# Altium footprint library NFC-Reader.PcbLib: 67 footprints (part 4 of 5)
Each footprint in its own frame and in the unit in brackets; x right, y up, seen from the top. Pads: shape width x height; smd on the part's side, far side on the other; paste and mask are expansions set on the pad; w line width, h text height; cw(c..) or ccw(c..) is an arc to the next point about the centre after c.
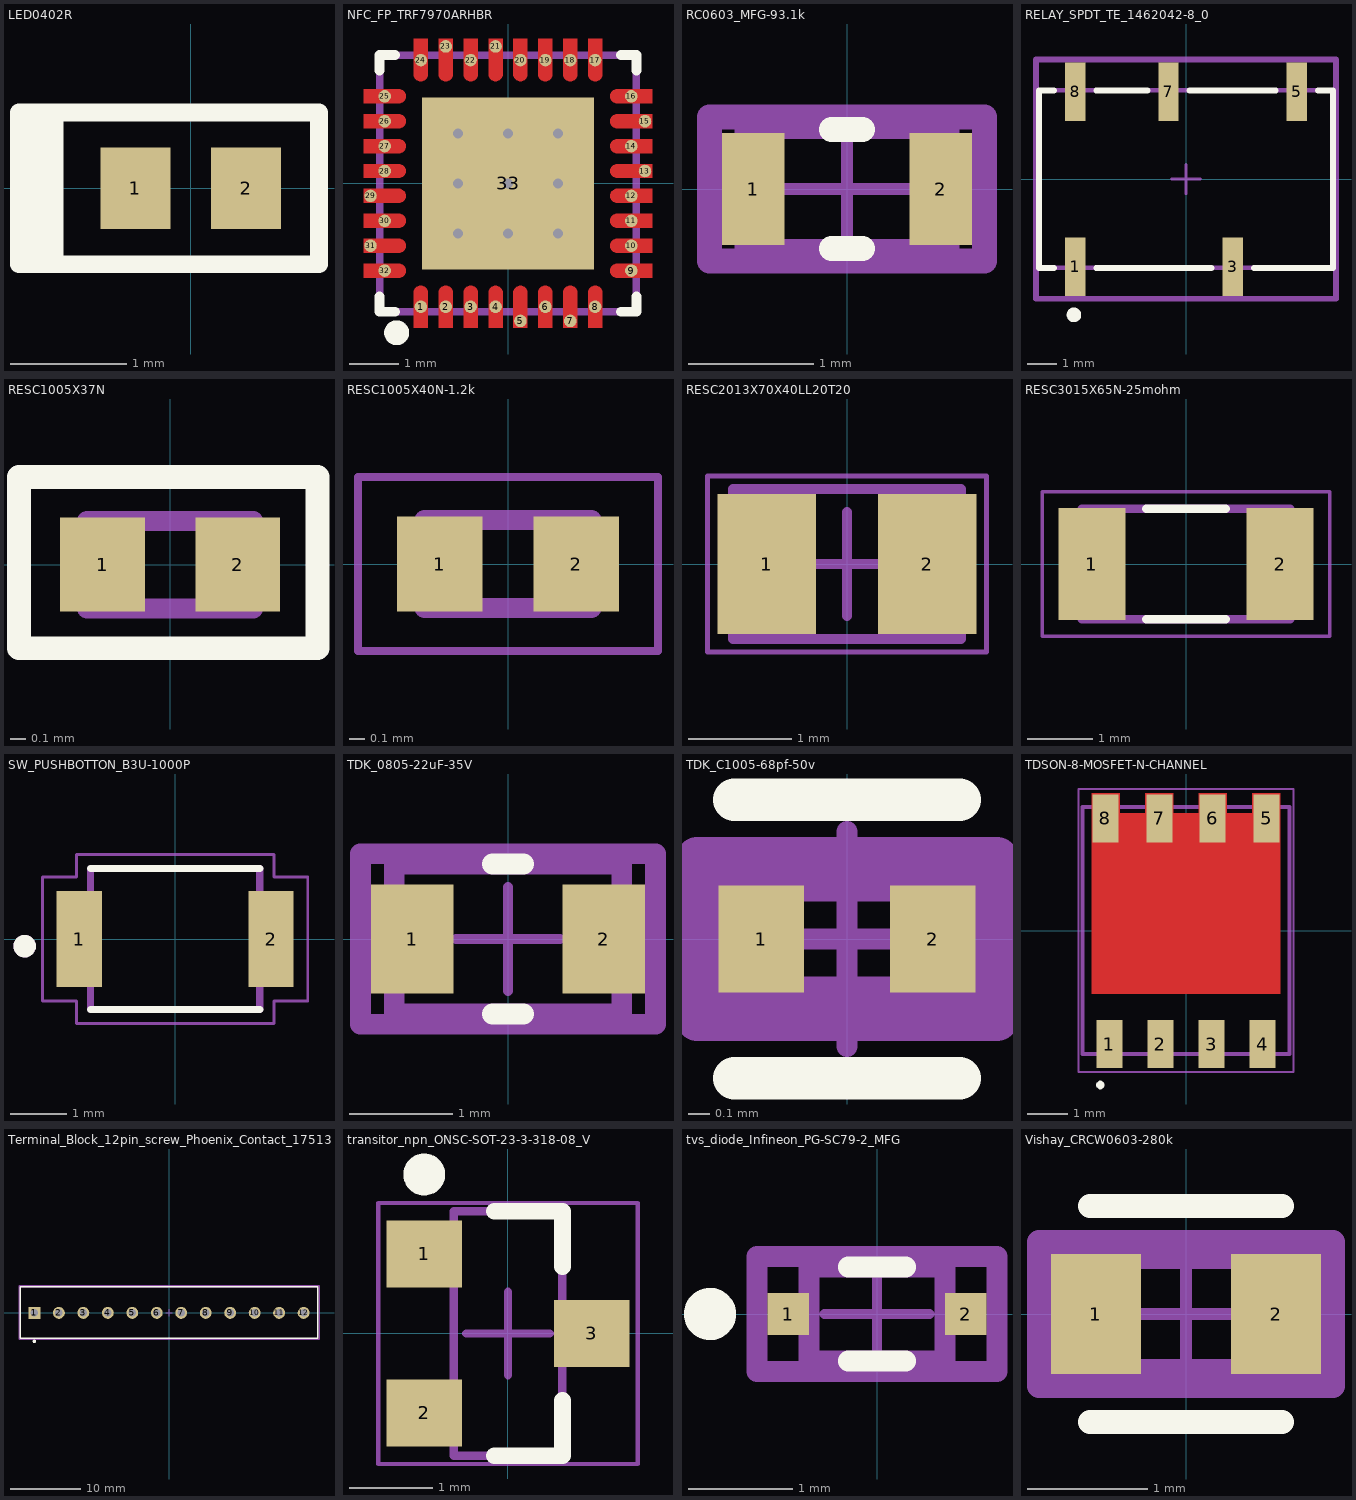
[diagram p3: the footprints below, top view; thin cyan lines are the x and y axes]

## LED0402R [mm]
pads (2):
  rect 0.6x0.7 smd: 1(-0.475,0) 2(0.475,0)
Top Overlay:
  rectangle: -1.473,-0.66 -1.092,0.65
  lines w0.152: -1.473,-0.65 1.1,-0.65 1.1,0.65 -1.473,0.65 -1.473,-0.65
3D body "User Library-LED_1006_R.STEP": height 0.2, standoff 0, extent -0.5,-0.3 0.5,0.3

## NFC_FP_TRF7970ARHBR [mm]
pads (33):
  round 0.252 smd paste-1000 mask+0: 1(-1.75,-2.475) 2(-1.25,-2.475) 3(-0.75,-2.475) 4(-0.25,-2.475) 5(0.25,-2.76) 6(0.75,-2.475) 7(1.25,-2.76) 8(1.75,-2.475) 9(2.475,-1.75) 10(2.475,-1.25) 11(2.475,-0.75) 12(2.475,-0.25) 13(2.75,0.25) 14(2.475,0.75) 15(2.75,1.25) 16(2.475,1.75) 17(1.75,2.475) 18(1.25,2.475) 19(0.75,2.475) 20(0.25,2.475) 21(-0.25,2.75) 22(-0.75,2.475) 23(-1.25,2.75) 24(-1.75,2.475) 25(-2.475,1.75) 26(-2.475,1.25) 27(-2.475,0.75) 28(-2.475,0.25) 29(-2.76,-0.25) 30(-2.475,-0.75) 31(-2.76,-1.25) 32(-2.475,-1.75)
  rect 3.45x3.45 smd paste-1000 mask+0: 33(0,0)
via -1,1 diameter 0.5 hole 0.2
via 0,1 diameter 0.5 hole 0.2
via 1,1 diameter 0.5 hole 0.2
via -1,0 diameter 0.5 hole 0.2
via 0,0 diameter 0.5 hole 0.2
via 1,0 diameter 0.5 hole 0.2
via -1,-1 diameter 0.5 hole 0.2
via 0,-1 diameter 0.5 hole 0.2
via 1,-1 diameter 0.5 hole 0.2
Top Layer:
  region: -1.89,-2.9 -1.89,-2.19 -1.89,-2.162 -1.869,-2.111 -1.829,-2.071 -1.778,-2.05 -1.75,-2.05 -1.722,-2.05 -1.671,-2.071 -1.631,-2.111 -1.61,-2.162 -1.61,-2.19 -1.61,-2.9
  region: -1.39,-2.9 -1.39,-2.19 -1.39,-2.162 -1.369,-2.111 -1.329,-2.071 -1.278,-2.05 -1.25,-2.05 -1.222,-2.05 -1.171,-2.071 -1.131,-2.111 -1.11,-2.162 -1.11,-2.19 -1.11,-2.9
  region: -0.89,-2.9 -0.89,-2.19 -0.89,-2.162 -0.869,-2.111 -0.829,-2.071 -0.778,-2.05 -0.75,-2.05 -0.722,-2.05 -0.671,-2.071 -0.631,-2.111 -0.61,-2.162 -0.61,-2.19 -0.61,-2.9
  region: -0.39,-2.9 -0.39,-2.19 -0.39,-2.162 -0.369,-2.111 -0.329,-2.071 -0.278,-2.05 -0.25,-2.05 -0.222,-2.05 -0.171,-2.071 -0.131,-2.111 -0.11,-2.162 -0.11,-2.19 -0.11,-2.9
  region: 0.11,-2.9 0.11,-2.19 0.11,-2.162 0.131,-2.111 0.171,-2.071 0.222,-2.05 0.25,-2.05 0.278,-2.05 0.329,-2.071 0.369,-2.111 0.39,-2.162 0.39,-2.19 0.39,-2.9
  region: 0.61,-2.9 0.61,-2.19 0.61,-2.162 0.631,-2.111 0.671,-2.071 0.722,-2.05 0.75,-2.05 0.778,-2.05 0.829,-2.071 0.869,-2.111 0.89,-2.162 0.89,-2.19 0.89,-2.9
  region: 1.11,-2.9 1.11,-2.19 1.11,-2.162 1.131,-2.111 1.171,-2.071 1.222,-2.05 1.25,-2.05 1.278,-2.05 1.329,-2.071 1.369,-2.111 1.39,-2.162 1.39,-2.19 1.39,-2.9
  region: 1.61,-2.9 1.61,-2.19 1.61,-2.162 1.631,-2.111 1.671,-2.071 1.722,-2.05 1.75,-2.05 1.778,-2.05 1.829,-2.071 1.869,-2.111 1.89,-2.162 1.89,-2.19 1.89,-2.9
  region: 1.89,2.9 1.89,2.19 1.89,2.162 1.869,2.111 1.829,2.071 1.778,2.05 1.75,2.05 1.722,2.05 1.671,2.071 1.631,2.111 1.61,2.162 1.61,2.19 1.61,2.9
  region: 1.39,2.9 1.39,2.19 1.39,2.162 1.369,2.111 1.329,2.071 1.278,2.05 1.25,2.05 1.222,2.05 1.171,2.071 1.131,2.111 1.11,2.162 1.11,2.19 1.11,2.9
  region: 0.89,2.9 0.89,2.19 0.89,2.162 0.869,2.111 0.829,2.071 0.778,2.05 0.75,2.05 0.722,2.05 0.671,2.071 0.631,2.111 0.61,2.162 0.61,2.19 0.61,2.9
  region: 0.39,2.9 0.39,2.19 0.39,2.162 0.369,2.111 0.329,2.071 0.278,2.05 0.25,2.05 0.222,2.05 0.171,2.071 0.131,2.111 0.11,2.162 0.11,2.19 0.11,2.9
  region: -0.11,2.9 -0.11,2.19 -0.11,2.162 -0.131,2.111 -0.171,2.071 -0.222,2.05 -0.25,2.05 -0.278,2.05 -0.329,2.071 -0.369,2.111 -0.39,2.162 -0.39,2.19 -0.39,2.9
  region: -0.61,2.9 -0.61,2.19 -0.61,2.162 -0.631,2.111 -0.671,2.071 -0.722,2.05 -0.75,2.05 -0.778,2.05 -0.829,2.071 -0.869,2.111 -0.89,2.162 -0.89,2.19 -0.89,2.9
  region: -1.11,2.9 -1.11,2.19 -1.11,2.162 -1.131,2.111 -1.171,2.071 -1.222,2.05 -1.25,2.05 -1.278,2.05 -1.329,2.071 -1.369,2.111 -1.39,2.162 -1.39,2.19 -1.39,2.9
  region: -1.61,2.9 -1.61,2.19 -1.61,2.162 -1.631,2.111 -1.671,2.071 -1.722,2.05 -1.75,2.05 -1.778,2.05 -1.829,2.071 -1.869,2.111 -1.89,2.162 -1.89,2.19 -1.89,2.9
  region: 2.9,-1.89 2.19,-1.89 2.162,-1.89 2.111,-1.869 2.071,-1.829 2.05,-1.778 2.05,-1.75 2.05,-1.722 2.071,-1.671 2.111,-1.631 2.162,-1.61 2.19,-1.61 2.9,-1.61
  region: 2.9,-1.39 2.19,-1.39 2.162,-1.39 2.111,-1.369 2.071,-1.329 2.05,-1.278 2.05,-1.25 2.05,-1.222 2.071,-1.171 2.111,-1.131 2.162,-1.11 2.19,-1.11 2.9,-1.11
  region: 2.9,-0.89 2.19,-0.89 2.162,-0.89 2.111,-0.869 2.071,-0.829 2.05,-0.778 2.05,-0.75 2.05,-0.722 2.071,-0.671 2.111,-0.631 2.162,-0.61 2.19,-0.61 2.9,-0.61
  region: 2.9,-0.39 2.19,-0.39 2.162,-0.39 2.111,-0.369 2.071,-0.329 2.05,-0.278 2.05,-0.25 2.05,-0.222 2.071,-0.171 2.111,-0.131 2.162,-0.11 2.19,-0.11 2.9,-0.11
  region: 2.9,0.11 2.19,0.11 2.162,0.11 2.111,0.131 2.071,0.171 2.05,0.222 2.05,0.25 2.05,0.278 2.071,0.329 2.111,0.369 2.162,0.39 2.19,0.39 2.9,0.39
  region: 2.9,0.61 2.19,0.61 2.162,0.61 2.111,0.631 2.071,0.671 2.05,0.722 2.05,0.75 2.05,0.778 2.071,0.829 2.111,0.869 2.162,0.89 2.19,0.89 2.9,0.89
  region: 2.9,1.11 2.19,1.11 2.162,1.11 2.111,1.131 2.071,1.171 2.05,1.222 2.05,1.25 2.05,1.278 2.071,1.329 2.111,1.369 2.162,1.39 2.19,1.39 2.9,1.39
  region: 2.9,1.61 2.19,1.61 2.162,1.61 2.111,1.631 2.071,1.671 2.05,1.722 2.05,1.75 2.05,1.778 2.071,1.829 2.111,1.869 2.162,1.89 2.19,1.89 2.9,1.89
  region: -2.9,1.89 -2.19,1.89 -2.162,1.89 -2.111,1.869 -2.071,1.829 -2.05,1.778 -2.05,1.75 -2.05,1.722 -2.071,1.671 -2.111,1.631 -2.162,1.61 -2.19,1.61 -2.9,1.61
  region: -2.9,1.39 -2.19,1.39 -2.162,1.39 -2.111,1.369 -2.071,1.329 -2.05,1.278 -2.05,1.25 -2.05,1.222 -2.071,1.171 -2.111,1.131 -2.162,1.11 -2.19,1.11 -2.9,1.11
  region: -2.9,0.89 -2.19,0.89 -2.162,0.89 -2.111,0.869 -2.071,0.829 -2.05,0.778 -2.05,0.75 -2.05,0.722 -2.071,0.671 -2.111,0.631 -2.162,0.61 -2.19,0.61 -2.9,0.61
  region: -2.9,0.39 -2.19,0.39 -2.162,0.39 -2.111,0.369 -2.071,0.329 -2.05,0.278 -2.05,0.25 -2.05,0.222 -2.071,0.171 -2.111,0.131 -2.162,0.11 -2.19,0.11 -2.9,0.11
  region: -2.9,-0.11 -2.19,-0.11 -2.162,-0.11 -2.111,-0.131 -2.071,-0.171 -2.05,-0.222 -2.05,-0.25 -2.05,-0.278 -2.071,-0.329 -2.111,-0.369 -2.162,-0.39 -2.19,-0.39 -2.9,-0.39
  region: -2.9,-0.61 -2.19,-0.61 -2.162,-0.61 -2.111,-0.631 -2.071,-0.671 -2.05,-0.722 -2.05,-0.75 -2.05,-0.778 -2.071,-0.829 -2.111,-0.869 -2.162,-0.89 -2.19,-0.89 -2.9,-0.89
  region: -2.9,-1.11 -2.19,-1.11 -2.162,-1.11 -2.111,-1.131 -2.071,-1.171 -2.05,-1.222 -2.05,-1.25 -2.05,-1.278 -2.071,-1.329 -2.111,-1.369 -2.162,-1.39 -2.19,-1.39 -2.9,-1.39
  region: -2.9,-1.61 -2.19,-1.61 -2.162,-1.61 -2.111,-1.631 -2.071,-1.671 -2.05,-1.722 -2.05,-1.75 -2.05,-1.778 -2.071,-1.829 -2.111,-1.869 -2.162,-1.89 -2.19,-1.89 -2.9,-1.89
Top Overlay:
  circle w0.25: c-2.235,-2.997 r0.125
  lines w0.2: -2.575,-2.265 -2.575,-2.575 -2.265,-2.575 ; -2.575,2.265 -2.575,2.575 -2.265,2.575 ; 2.265,-2.575 2.575,-2.575 2.575,-2.265 ; 2.265,2.575 2.575,2.575 2.575,2.265
Top Paste:
  drawing of 36 lines, arcs and shapes, not listed
Mechanical 10:
  text ".Designator" at 0,0 h1
Mechanical 12:
  lines w0.15: -2.575,-2.575 2.575,-2.575 2.575,2.575 -2.575,2.575 -2.575,-2.575
Top Courtyard:
  lines w0.1: -0.5,0 0.5,0 ; 0,-0.5 0,0.5
3D body "IC_Texas_Instruments_TRF7970ARHBR_eec.STEP": height 0.25, standoff 0, extent -3,-3 3,3

## RC0603_MFG-93.1k [mm]
pads (2):
  rect 0.5x0.9 smd paste+0 mask+0: 1(-0.75,0) 2(0.75,0)
Top Overlay:
  lines w0.2: -0.125,-0.475 0.125,-0.475 ; -0.125,0.475 0.125,0.475
Mechanical 10:
  lines w0.2: -1.1,-0.575 -1.1,0.575 1.1,0.575 1.1,-0.575 -1.1,-0.575
  text ".Designator" at 0,0 h1
Mechanical 12:
  lines w0.15: -0.825,-0.475 -0.825,0.475 0.825,0.475 0.825,-0.475 -0.825,-0.475
Top Courtyard:
  lines w0.1: -0.5,0 0.5,0 ; 0,-0.5 0,0.5
  lines w0.2: -1.1,-0.575 -1.1,0.575 1.1,0.575 1.1,-0.575 -1.1,-0.575
3D body "Res_Vishay_CRCW060310R0FKEA_eec.STEP": height 0.5, standoff 0, extent -0.775,-0.425 0.775,0.425

## RELAY_SPDT_TE_1462042-8_0 [mm]
pads (5):
  rect 0.7x2 smd paste+0 mask+0: 1(-3.8,-3) 3(1.6,-3) 5(3.8,3) 7(-0.6,3) 8(-3.8,3)
Top Overlay:
  circle w0.25: c-3.84,-4.65 r0.125
  lines w0.2: -4.525,-3.04 -5.04,-3.04 -5.04,3.04 -4.525,3.04 ; -3.075,-3.04 0.875,-3.04 ; -3.075,3.04 -1.325,3.04 ; 0.125,3.04 3.075,3.04 ; 2.325,-3.04 5.04,-3.04 5.04,3.04 4.525,3.04
Mechanical 10:
  lines w0.2: -5.14,-4.1 -5.14,4.1 5.14,4.1 5.14,-4.1 -5.14,-4.1
  text ".Designator" at 0,0 h1
Mechanical 12:
  lines w0.15: -5.04,-3.04 -5.04,3.04 5.04,3.04 5.04,-3.04 -5.04,-3.04
Top Courtyard:
  lines w0.1: -0.5,0 0.5,0 ; 0,-0.5 0,0.5
  lines w0.2: -5.14,-4.1 -5.14,4.1 5.14,4.1 5.14,-4.1 -5.14,-4.1
3D body "Relay_TE_1462042-8_eec.STEP": height 0.25, standoff 0, extent -5.14,-4.1 5.14,4.1

## RESC1005X37N [mm]
pads (2):
  rect 0.54x0.6 smd: 1(-0.432,0) 2(0.432,0)
Top Overlay:
  lines w0.152: -0.965,-0.533 0.94,-0.533 0.94,0.533 0.94,0.559 -0.965,0.559 -0.965,-0.533
Top 3D Body:
  lines w0.127: -0.53,-0.28 -0.53,0.28 0.53,0.28 0.53,-0.28 -0.53,-0.28
Top Courtyard:
  lines w0.05: -0.95,-0.55 -0.95,0.55 0.95,0.55 0.95,-0.55 -0.95,-0.55
3D body "step_temp.STEP": height 0.37, standoff 0, extent -0.5,-0.25 0.5,0.25

## RESC1005X40N-1.2k [mm]
pads (2):
  rect 0.54x0.6 smd paste+0 mask+0.102: 1(-0.432,0) 2(0.432,0)
Top 3D Body:
  lines w0.127: -0.53,-0.28 0.53,-0.28 0.53,0.28 -0.53,0.28 -0.53,-0.28
Top Courtyard:
  lines w0.05: -0.95,-0.55 0.95,-0.55 0.95,0.55 -0.95,0.55 -0.95,-0.55
3D body "step_temp.STEP": height 0.4, standoff 0, extent -0.5,-0.25 0.5,0.25

## RESC2013X70X40LL20T20 [mm] "Chip Resistor, 2-Leads, Body 2.00x1.25mm, IPC High Density"
height 0.7
pads (2):
  rect 0.95x1.35 smd: 1(-0.775,0) 2(0.775,0)
Top 3D Body:
  lines w0.1: -1.1,-0.725 1.1,-0.725 1.1,0.725 -1.1,0.725 -1.1,-0.725
Top Courtyard:
  lines w0.05: -1.35,-0.85 1.35,-0.85 1.35,0.85 -1.35,0.85 -1.35,-0.85
  lines w0.1: -0.5,0 0.5,0 ; 0,-0.5 0,0.5
3D body: height 0.7, standoff 0, extent 0.7,-0.725 1.1,0.725
3D body: height 0.7, standoff 0, extent -1.1,-0.725 -0.7,0.725
3D body: height 0.7, standoff 0, extent -0.7,-0.725 0.7,0.725

## RESC3015X65N-25mohm [mm]
pads (2):
  rect 1.03x1.72 smd: 1(-1.445,0) 2(1.445,0)
Top Overlay:
  lines w0.127: -0.61,-0.85 0.61,-0.85 ; -0.61,0.85 0.61,0.85
Top 3D Body:
  lines w0.127: -1.6,-0.85 1.6,-0.85 1.6,0.85 -1.6,0.85 -1.6,-0.85
Top Courtyard:
  lines w0.05: -2.21,-1.11 2.21,-1.11 2.21,1.11 -2.21,1.11 -2.21,-1.11
3D body "Res_Stackpole_Electronics_CSR1206FK25L0_eec.STEP": height 0.65, standoff 0, extent -1.525,-0.775 1.525,0.775

## SW_PUSHBOTTON_B3U-1000P [mm]
pads (2):
  rect 0.8x1.7 smd: 1(-1.7,0) 2(1.7,0)
Top Overlay:
  circle w0.2: c-2.667,-0.127 r0.1
  lines w0.127: -1.5,-1.25 1.5,-1.25 ; -1.5,1.25 1.5,1.25
Top 3D Body:
  circle w0.2: c-2.667,-0.127 r0.1
  lines w0.127: -1.5,-1.25 1.5,-1.25 1.5,1.25 -1.5,1.25 -1.5,-1.25
Top Courtyard:
  lines w0.05: -2.35,-1.1 -2.35,1.1 -1.75,1.1 -1.75,1.5 1.75,1.5 1.75,1.1 2.35,1.1 2.35,-1.1 1.75,-1.1 1.75,-1.5 -1.75,-1.5 -1.75,-1.1 -2.35,-1.1
3D body "B3U-1000P--3DModel-STEP-56544.STEP": height 1.76, standoff 0.01, extent -2,-1.25 2,1.25

## TDK_0805-22uF-35V [mm]
pads (2):
  rect 0.8x1.05 smd paste+0 mask+0: 1(-0.925,0) 2(0.925,0)
Top Overlay:
  lines w0.2: -0.15,-0.725 0.15,-0.725 ; -0.15,0.725 0.15,0.725
Mechanical 10:
  lines w0.2: -1.425,-0.825 -1.425,0.825 1.425,0.825 1.425,-0.825 -1.425,-0.825
  text ".Designator" at 0,0.188 h1
Mechanical 12:
  lines w0.2: -1.1,-0.725 -1.1,0.725 1.1,0.725 1.1,-0.725 -1.1,-0.725
Top Courtyard:
  lines w0.1: -0.5,0 0.5,0 ; 0,-0.5 0,0.5
  lines w0.2: -1.425,-0.825 -1.425,0.825 1.425,0.825 1.425,-0.825 -1.425,-0.825
3D body "Cap_TDK_C2012X5R1V226M125AC_eec.STEP": height 0.25, standoff 0, extent -1.425,-0.825 1.425,0.825

## TDK_C1005-68pf-50v [mm]
pads (2):
  rect 0.4x0.5 smd paste+0 mask+0: 1(-0.4,0) 2(0.4,0)
Top Overlay:
  lines w0.2: -0.525,-0.65 0.525,-0.65 ; -0.525,0.65 0.525,0.65
Mechanical 10:
  lines w0.2: -0.7,-0.375 -0.7,0.375 0.7,0.375 0.7,-0.375 -0.7,-0.375
  text ".Designator" at 0,0.188 h1
Mechanical 12:
  lines w0.2: -0.525,-0.275 -0.525,0.275 0.525,0.275 0.525,-0.275 -0.525,-0.275
Top Courtyard:
  lines w0.1: -0.5,0 0.5,0 ; 0,-0.5 0,0.5
  lines w0.2: -0.7,-0.375 -0.7,0.375 0.7,0.375 0.7,-0.375 -0.7,-0.375
3D body "Cap_TDK_C1005C0G1H680J050BA_eec.STEP": height 0.25, standoff 0, extent -0.7,-0.375 0.7,0.375

## TDSON-8-MOSFET-N-CHANNEL [mm] "TDSON, 8-Leads, Body 6.15x5.15mm, Pitch 1.27mm"
height 1
pads (8):
  rect 0.65x1.2 smd: 1(-1.905,-2.825) 2(-0.635,-2.825) 3(0.635,-2.825) 4(1.905,-2.825) 5(2.007,2.794) 6(0.66,2.794) 7(-0.66,2.794) 8(-2.007,2.794)
Top Layer:
  region: -2.35,2.925 -2.35,-1.575 2.35,-1.575 2.35,2.925
  region: -2.35,2.925 -1.65,2.925 -1.65,3.425 -2.35,3.425
  region: 1.65,2.925 2.35,2.925 2.35,3.425 1.65,3.425
  region: -1.015,2.925 -0.315,2.925 -0.315,3.425 -1.015,3.425
  region: 0.315,2.925 1.015,2.925 1.015,3.425 0.315,3.425
Top Overlay:
  region: -2.234,-3.842 -2.234,-3.862 -2.218,-3.899 -2.19,-3.927 -2.153,-3.942 -2.134,-3.942 -2.114,-3.942 -2.077,-3.927 -2.049,-3.899 -2.034,-3.862 -2.034,-3.842 -2.034,-3.822 -2.049,-3.785 -2.077,-3.757 -2.114,-3.742 -2.134,-3.742 -2.153,-3.742 -2.19,-3.757 -2.218,-3.785 -2.234,-3.822
Top 3D Body:
  lines w0.1: -2.575,-3.075 -2.575,3.075 2.575,3.075 2.575,-3.075 -2.575,-3.075
Top Courtyard:
  lines w0.05: -2.675,-3.525 -2.675,3.525 2.675,3.525 2.675,-3.525 -2.675,-3.525
  lines w0.1: -0.5,0 0.5,0 ; 0,-0.5 0,0.5
3D body: height 1, standoff 0, extent -2.575,-3.075 2.575,3.075

## Terminal_Block_12pin_screw_Phoenix_Contact_1751345_0 [mm]
pads (12):
  rect 1.7x1.7 hole 1.1 paste-2539.97 mask+0: 1(-19.25,-0.05)
  round 1.7 hole 1.1 paste-2539.97 mask+0: 2(-15.75,-0.05) 3(-12.25,-0.05) 4(-8.75,-0.05) 5(-5.25,-0.05) 6(-1.75,-0.05) 7(1.75,-0.05) 8(5.25,-0.05) 9(8.75,-0.05) 10(12.25,-0.05) 11(15.75,-0.05) 12(19.25,-0.05)
Top Overlay:
  circle w0.25: c-19.25,-4.125 r0.125
  lines w0.2: -21.25,-3.65 21.25,-3.65 21.25,3.65 -21.25,3.65 -21.25,-3.65
Mechanical 10:
  lines w0.2: -21.45,-3.825 21.45,-3.825 21.45,3.825 -21.45,3.825 -21.45,-3.825
  text ".Designator" at 0,0 h1
Mechanical 12:
  lines w0.15: -21.25,-3.65 21.25,-3.65 21.25,3.65 -21.25,3.65 -21.25,-3.65
Top Courtyard:
  lines w0.1: -0.5,0 0.5,0 ; 0,-0.5 0,0.5
  lines w0.2: -21.45,-3.825 21.45,-3.825 21.45,3.825 -21.45,3.825 -21.45,-3.825
3D body "pxc_1751345_03_MKDS-1-12-3-5_3D.stp": height 8.5, standoff -3.5, extent -21.336,-3.744 21.164,3.556

## transitor_npn_ONSC-SOT-23-3-318-08_V [mm] "SOT23, 3-Leads, Body 2.92x1.3mm, Pitch 0.95mm"
height 1.11
pads (3):
  rect 0.9x0.8 smd: 1(-1,0.95) 2(-1,-0.95) 3(1,0)
Top Overlay:
  circle w0.25: c-1,1.9 r0.125
  lines w0.2: -0.165,-1.46 0.65,-1.46 0.65,-0.8 ; -0.165,1.46 0.65,1.46 0.65,0.8
Top 3D Body:
  lines w0.1: -0.65,-1.46 -0.65,1.46 0.65,1.46 0.65,-1.46 -0.65,-1.46
Top Courtyard:
  lines w0.05: -1.55,-1.56 -1.55,1.56 1.55,1.56 1.55,-1.56 -1.55,-1.56
  lines w0.1: -0.5,0 0.5,0 ; 0,-0.5 0,0.5
3D body: height 1.11, standoff 0.01, extent -0.65,-1.46 0.65,1.46

## tvs_diode_Infineon_PG-SC79-2_MFG [mm]
pads (2):
  rect 0.4x0.4 smd paste+0 mask+0: 1(-0.85,0) 2(0.85,0)
Top Overlay:
  circle w0.25: c-1.6,0 r0.125
  lines w0.2: -0.275,-0.45 0.275,-0.45 ; -0.275,0.45 0.275,0.45
Mechanical 10:
  lines w0.2: -1.15,-0.55 1.15,-0.55 1.15,0.55 -1.15,0.55 -1.15,-0.55
  text ".Designator" at 0,-0.001 h1
Mechanical 12:
  lines w0.2: -0.65,-0.45 0.65,-0.45 0.65,0.45 -0.65,0.45 -0.65,-0.45
Top Courtyard:
  lines w0.1: -0.5,0 0.5,0 ; 0,-0.5 0,0.5
  lines w0.2: -1.15,-0.55 1.15,-0.55 1.15,0.55 -1.15,0.55 -1.15,-0.55
3D body "Diode_Infineon_ESD5V0S1U02VH6327XTSA1_eec.STEP": height 0.25, standoff 0, extent -1.15,-0.55 1.15,0.55

## Vishay_CRCW0603-280k [mm]
pads (2):
  rect 0.75x1 smd paste+0 mask+0: 1(-0.75,0) 2(0.75,0)
Top Overlay:
  lines w0.2: -0.8,-0.9 0.8,-0.9 ; -0.8,0.9 0.8,0.9
Mechanical 10:
  lines w0.2: -1.225,-0.6 -1.225,0.6 1.225,0.6 1.225,-0.6 -1.225,-0.6
  text ".Designator" at 0,0.188 h1
Mechanical 12:
  lines w0.2: -0.825,-0.475 -0.825,0.475 0.825,0.475 0.825,-0.475 -0.825,-0.475
Top Courtyard:
  lines w0.1: -0.5,0 0.5,0 ; 0,-0.5 0,0.5
  lines w0.2: -1.225,-0.6 -1.225,0.6 1.225,0.6 1.225,-0.6 -1.225,-0.6
3D body "Res_Vishay_CRCW0603280KFKEA_eec.STEP": height 0.25, standoff 0, extent -1.225,-0.6 1.225,0.6